# Altium footprint library 开关.PcbLib: 26 footprints (part 1 of 2)
Each footprint in its own frame and in the unit in brackets; x right, y up, seen from the top. Pads: shape width x height; smd on the part's side, far side on the other; paste and mask are expansions set on the pad; w line width, h text height; cw(c..) or ccw(c..) is an arc to the next point about the centre after c.
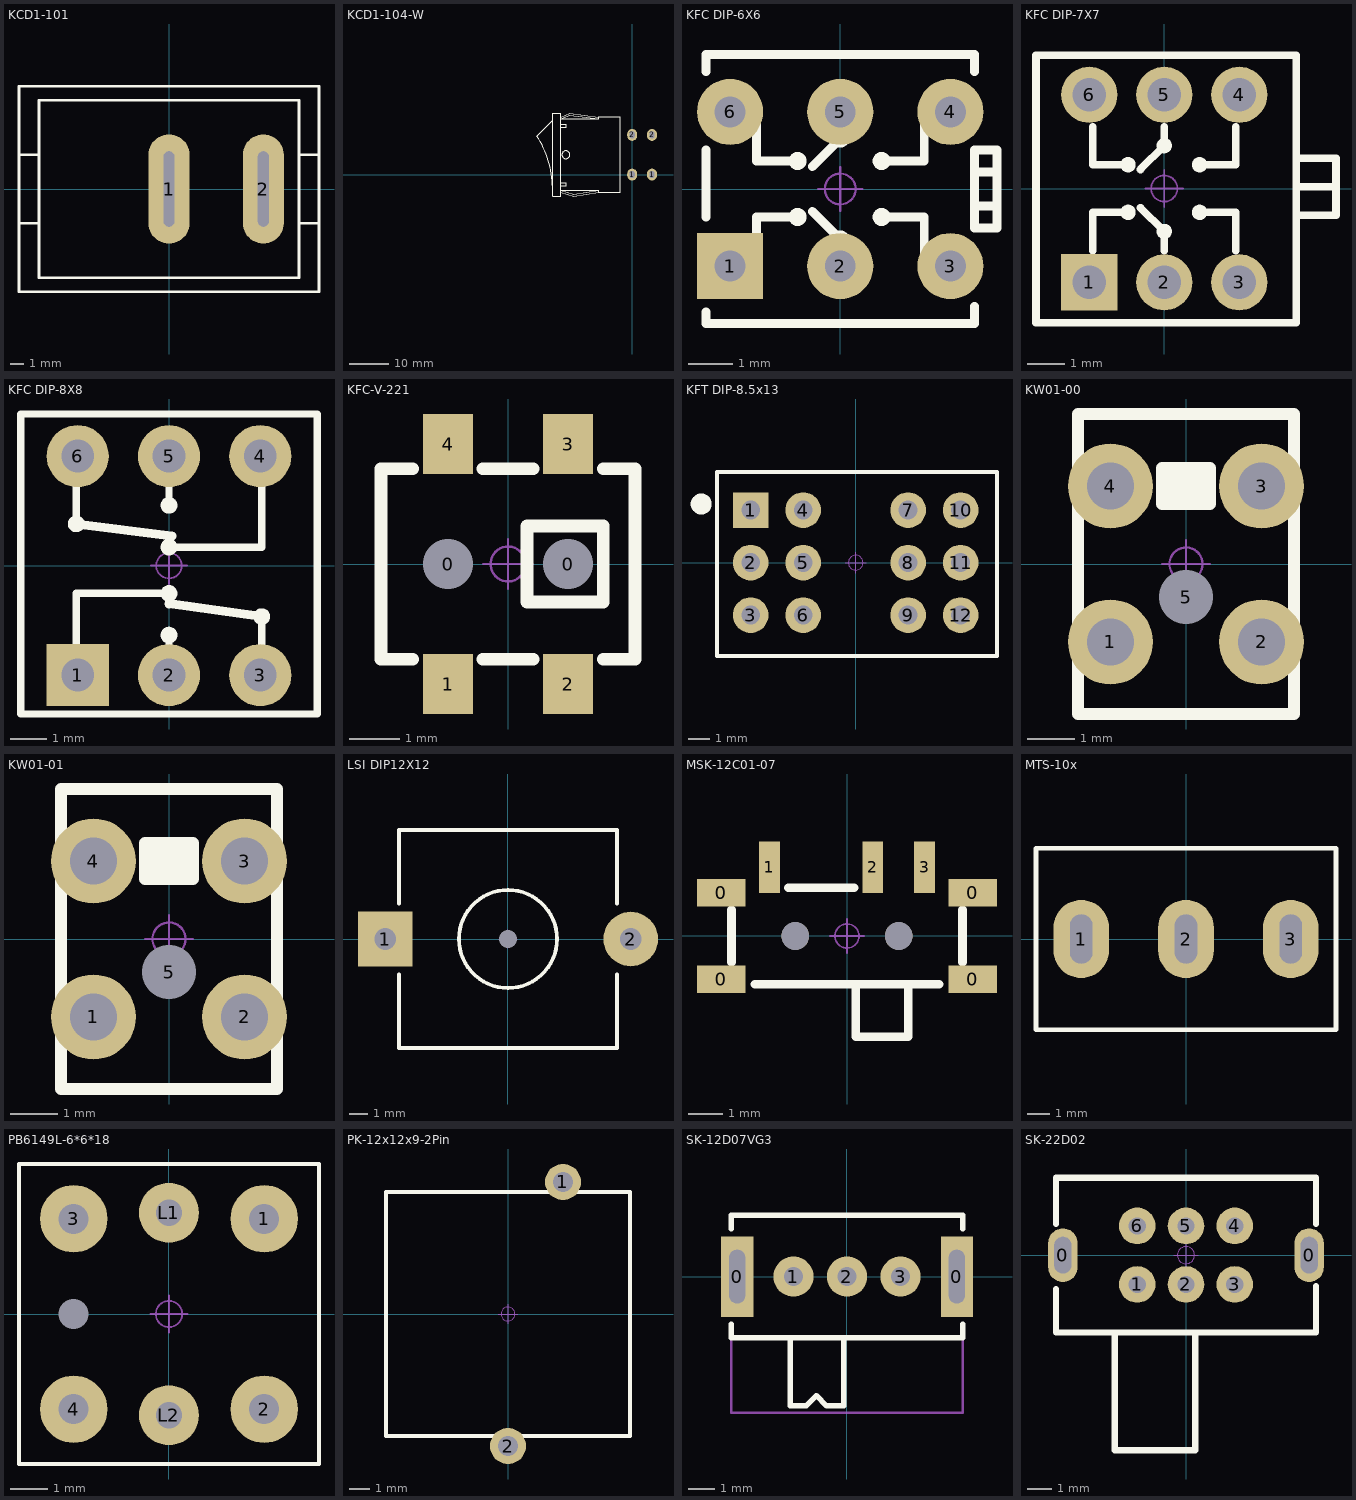
[diagram p0: the footprints below, top view; thin cyan lines are the x and y axes]

## KCD1-101 [mm] "船型开关立式"
pads (2):
  oval 3x8 hole 0.8 slot 5.5 at 90 deg: 1(0,0) 2(6.9,0)
Top Overlay:
  lines w0.203: -10.973,-2.5 -9.5,-2.5 ; -10.973,2.5 -9.5,2.5 ; 9.5,-2.5 10.973,-2.5 ; 9.5,2.5 10.973,2.5 ; -10.973,-7.518 -10.973,7.518 10.973,7.518 10.973,-7.518 -10.973,-7.518 ; -9.5,-6.5 -9.5,6.5 9.5,6.5 9.5,-6.5 -9.5,-6.5
Mechanical 15:
  circle w0.05: c0,0 r0.35
  lines w0.05: -0.5,0 0.5,0 ; 0,-0.5 0,0.5
3D body: height 20.3, standoff -5.8, extent -10.951,-7.5 10.95,7.5

## KCD1-104-W [mm] "船型开关-卧式"
pads (4):
  oval 2.5x3 hole 1.2 slot 1.7 at 90 deg mask+0: 1(0,0) 1(5,0) 2(0,10) 2(5,10)
Top Overlay:
  circle w0.1: c-16.7,5 r1
  lines w0.1: -20.041,-3.203 ccw(c-44.537,-3.63) -23.99,9.714 -19.994,13.71 ; -18,-4.5 -14.7,-5.5 -8.4,-4.5 ; -18,-4 -14.7,-5 -8.4,-4 ; -17.985,-4 -8.4,-4 ; -17.984,14.498 -15.684,15.498 -8.4,14.498 ; -17.972,-2.794 -16.575,-2.794 -16.575,-2.007 -17.972,-2.007 ; -17.972,11.862 -16.575,11.862 -16.575,12.649 -17.972,12.649 ; -8.4,13.995 -8.4,14.503 ; -8.4,14.5 -3,14.5 -3,-4.5 -8.4,-4.5 ; -8.4,-4.5 -8.4,-4 ; -20,-5.5 -18,-5.5 -18,15.5 -20,15.5 -20,-5.5 ; -17.984,13.998 -8.4,13.998 -15.684,14.998 -17.984,13.998
3D body: height 15.1, standoff -3.35, extent -24.2,-5.951 5.4,15.951

## KFC DIP-6X6 [mm] "自锁开关，规格：6*6*12.5mm"
pads (6):
  rect 1.5x1.5 hole 0.7: 1(-2.5,-1.75)
  round 1.5 hole 0.7: 2(0,-1.75) 3(2.5,-1.75) 4(2.5,1.75) 5(0,1.75) 6(-2.5,1.75)
Top Overlay:
  circle w0.254: c0.94,0.635 r0.076
  circle w0.254: c-0.965,0.635 r0.076
  circle w0.254: c0,1.143 r0.076
  circle w0.254: c0,-1.143 r0.076
  circle w0.254: c-0.965,-0.635 r0.076
  circle w0.254: c0.94,-0.635 r0.076
  lines w0.203: -3.048,-2.794 -3.048,-3.048 3.048,-3.048 3.048,-2.667 ; -3.048,-0.635 -3.048,0.889 ; -3.048,2.667 -3.048,3.048 3.048,3.048 3.048,2.667 ; -1.905,-1.651 -1.905,-0.635 -0.889,-0.635 ; -1.905,1.651 -1.905,0.635 -0.889,0.635 ; -0.635,-0.508 0,-1.143 0,-1.651 ; -0.635,0.508 0,1.143 0,1.651 ; 1.016,-0.635 1.905,-0.635 1.905,-1.651 ; 1.016,0.635 1.905,0.635 1.905,1.651 ; 3.048,-0.381 3.556,-0.381 ; 3.048,0.381 3.556,0.381 ; 3.048,-0.889 3.048,0.889 3.429,0.889 3.556,0.889 3.556,-0.889 3.048,-0.889
Mechanical 15:
  circle w0.05: c0,0 r0.35
  lines w0.05: -0.5,0 0.5,0 ; 0,-0.5 0,0.5
3D body: height 12.5, standoff -3.5, extent -3,-3 3.5,3

## KFC DIP-7X7 [mm] "自锁开关，规格：7*7mm"
pads (6):
  rect 1.5x1.5 hole 0.9: 1(-2,-2.5)
  round 1.5 hole 0.9: 2(0,-2.5) 3(2,-2.5) 4(2,2.5) 5(0,2.5) 6(-2,2.5)
Top Overlay:
  circle w0.254: c0.94,-0.635 r0.076
  circle w0.254: c-0.965,-0.635 r0.076
  circle w0.254: c0,-1.143 r0.076
  circle w0.254: c0,1.143 r0.076
  circle w0.254: c-0.965,0.635 r0.076
  circle w0.254: c0.94,0.635 r0.076
  lines w0.203: -1.905,-1.651 -1.905,-0.635 -0.889,-0.635 ; -1.905,1.651 -1.905,0.635 -0.889,0.635 ; -0.635,-0.508 0,-1.143 0,-1.651 ; -0.635,0.508 0,1.143 0,1.651 ; 1.016,-0.635 1.905,-0.635 1.905,-1.651 ; 1.016,0.635 1.905,0.635 1.905,1.651 ; 3.514,0.05 4.579,0.05 ; 3.563,-0.712 4.579,-0.712 4.579,0.812 3.563,0.812 ; -3.42,-3.581 3.514,-3.581 3.514,2.54 3.514,3.556 -3.42,3.556 -3.42,-3.581
Mechanical 15:
  circle w0.05: c0,0 r0.35
  lines w0.05: -0.5,0 0.5,0 ; 0,-0.5 0,0.5
3D body: height 11.2, standoff -3.2, extent -3.5,-3.5 3.5,3.5

## KFC DIP-8X8 [mm] "自锁开关，规格：8*8mm"
pads (6):
  rect 1.7x1.7 hole 0.9: 1(-2.5,-3)
  round 1.7 hole 0.9: 2(0,-3) 3(2.5,-3) 4(2.5,3) 5(0,3) 6(-2.5,3)
Top Overlay:
  circle w0.254: c-2.54,1.143 r0.102
  circle w0.254: c0,1.651 r0.102
  circle w0.254: c0,-1.905 r0.102
  circle w0.254: c2.54,-1.397 r0.102
  circle w0.254: c0,0.508 r0.102
  circle w0.254: c0,-0.762 r0.102
  lines w0.2: -4.064,-4.064 4.064,-4.064 4.064,4.153 -4.064,4.153 -4.064,-4.064
  lines w0.203: -2.54,-3.048 -2.54,-0.762 0,-0.762 ; -2.54,1.143 -2.54,2.794 ; 0,-3.048 0,-1.771 ; 0,0.508 2.54,0.508 2.54,2.794 ; 0,1.6 0,2.794 ; 2.54,-3.048 2.54,-1.397
  lines w0.254: -2.54,1.143 0.076,0.813 ; 0,-1.041 2.54,-1.397
Mechanical 15:
  circle w0.05: c0,0 r0.35
  lines w0.05: -0.5,0 0.5,0 ; 0,-0.5 0,0.5
3D body: height 13.1, standoff -3.2, extent -3.949,-3.949 4.051,4.051

## KFC-V-221 [mm] "长：4.75mm，宽：3.7mm，高：3.8mm"
pads (6):
  round 0.9 hole 1 unplated: 0(-1.2,0) 0(1.2,0)
  rect 1x1.2 smd: 1(-1.2,-2.4) 2(1.2,-2.4) 3(1.2,2.4) 4(-1.2,2.4)
Top Overlay:
  lines w0.254: -1.905,-1.905 -2.54,-1.905 -2.54,1.905 -1.905,1.905 ; -0.508,-1.905 0.508,-1.905 ; -0.508,1.905 0.508,1.905 ; 1.905,-1.905 2.54,-1.905 2.54,1.905 1.905,1.905 ; 0.381,-0.762 1.905,-0.762 1.905,0.762 0.381,0.762 0.381,-0.762
Mechanical 15:
  circle w0.05: c0,0 r0.35
  lines w0.05: -0.5,0 0.5,0 ; 0,-0.5 0,0.5
3D body: height 3.76, standoff -0.35, extent -2.375,-2.6 2.375,2.6

## KFT DIP-8.5x13 [mm] "自锁开关，规格：8.5*13mm"
pads (12):
  rect 1.7x1.7 hole 0.9: 1(-5,2.5)
  round 1.7 hole 0.9: 2(-5,0) 3(-5,-2.5) 4(-2.5,2.5) 5(-2.5,0) 6(-2.5,-2.5) 7(2.5,2.5) 8(2.5,0) 9(2.5,-2.5) 10(5,2.5) 11(5,0) 12(5,-2.5)
Top Overlay:
  circle w0.6: c-7.359,2.794 r0.2
  lines w0.2: -6.604,-4.445 6.731,-4.445 6.731,4.318 -6.604,4.318 -6.604,-4.445
Mechanical 15:
  circle w0.05: c0,0 r0.35
  lines w0.05: -0.5,0 0.5,0 ; 0,-0.5 0,0.5
3D body: height 14, standoff -3.2, extent -6.449,-4.301 6.551,4.199

## KW01-00 [mm] "长：6.4mm，宽：3.0mm，高：8.5mm"
pads (5):
  round 1.8 hole 1: 1(-1.6,-1.65) 2(1.6,-1.65) 3(1.6,1.65) 4(-1.6,1.65)
  round 1.1 hole 1.15 unplated: 5(0,-0.7)
Top Overlay:
  lines w0.254: -0.508,1.778 0.508,1.778 ; -0.381,1.524 0.508,1.524 ; -2.286,-3.175 2.286,-3.175 2.286,3.175 -2.286,3.175 -2.286,-3.175 ; -0.508,1.27 -0.508,2.032 0.508,2.032 0.508,1.27 -0.508,1.27
Mechanical 15:
  circle w0.05: c0,0 r0.35
  lines w0.05: -0.5,0 0.5,0 ; 0,-0.5 0,0.5
3D body: height 8.7, standoff -2.9, extent -2.128,-3 2.128,3

## KW01-01 [mm] "长：6.4mm，宽：3.0mm，高：11mm"
pads (5):
  round 1.8 hole 1: 1(-1.6,-1.65) 2(1.6,-1.65) 3(1.6,1.65) 4(-1.6,1.65)
  round 1.1 hole 1.15 unplated: 5(0,-0.7)
Top Overlay:
  lines w0.254: -0.508,1.778 0.508,1.778 ; -0.381,1.524 0.508,1.524 ; -2.286,-3.175 -2.286,3.175 2.286,3.175 2.286,-3.175 -2.286,-3.175 ; -0.508,1.27 0.508,1.27 0.508,2.032 -0.508,2.032 -0.508,1.27
Mechanical 15:
  circle w0.05: c0,0 r0.35
  lines w0.05: -0.5,0 0.5,0 ; 0,-0.5 0,0.5
3D body: height 11.2, standoff -2.9, extent -2.128,-3 2.128,3

## LSI DIP12X12 [mm] "12mm*12mm*9.4mm(长*宽*高)"
pads (3):
  round 0 hole 1: 0(0,0)
  rect 3x3 hole 1.2: 1(-6.75,0)
  round 3 hole 1.2: 2(6.75,0)
Top Overlay:
  circle w0.203: c0,0 r2.7
  lines w0.203: -6,-1.936 -6,-6 6,-6 6,-1.936 ; -6,1.936 -6,6 6,6 6,1.936
Mechanical 15:
  circle w0.05: c0,0 r0.35
  lines w0.05: -0.5,0 0.5,0 ; 0,-0.5 0,0.5
3D body: height 8.5, standoff -3.51, extent -6.925,-6 6.924,6

## MSK-12C01-07 [mm] "6.7*2.8*1.5mm(长宽高）"
pads (9):
  rect 1.4x0.8 smd: 0(-3.65,-1.25) 0(-3.65,1.25) 0(3.65,-1.25) 0(3.65,1.25)
  rect 0.6x1.5 smd: 1(-2.25,1.996) 2(0.75,1.996) 3(2.25,1.996)
  round 0.8 hole 0.8: " "(-1.5,0) " "(1.5,0)
Top Overlay:
  lines w0.254: -3.35,-0.762 -3.35,0.762 ; -2.667,-1.397 2.667,-1.397 ; -1.699,1.397 0.206,1.397 ; 0.254,-1.4 0.254,-2.921 1.778,-2.921 1.778,-1.4 ; 3.35,-0.762 3.35,0.762
Mechanical 15:
  circle w0.05: c0,0 r0.35
  lines w0.05: -0.5,0 0.5,0 ; 0,-0.5 0,0.5
3D body: height 1.5, standoff -0.5, extent -3.92,-2.9 3.92,2.4

## MTS-10x [mm] "MTS10系列3脚扭子开关"
pads (3):
  oval 2.5x3.5 hole 1 slot 2.2 at 90 deg unplated: 1(-4.7,0) 2(0,0) 3(4.7,0)
Top Overlay:
  lines w0.203: -6.731,-4.064 6.731,-4.064 6.731,4.064 -6.731,4.064 -6.731,-4.064
Mechanical 15:
  circle w0.05: c0,0 r0.35
  lines w0.05: -0.5,0 0.5,0 ; 0,-0.5 0,0.5
3D body: height 30.47, standoff -2.95, extent -6.6,-3.95 6.6,3.95

## PB6149L-6*6*18 [mm] "6mm*6mm*18mm(长*宽*高)"
pads (7):
  round 1.8 hole 0.8: 1(2.54,2.54) 2(2.54,-2.54) 3(-2.54,2.54) 4(-2.54,-2.54)
  round 0 hole 0.8: 7(-2.54,0)
  round 1.6 hole 0.7: L1(0,2.7) L2(0,-2.7)
Top Overlay:
  lines w0.1: -4,-4 -4,4 4,4 4,-4 -4,-4
Mechanical 15:
  circle w0.05: c0,0 r0.35
  lines w0.05: -0.5,0 0.5,0 ; 0,-0.5 0,0.5
3D body: height 18.05, standoff -3.45, extent -4,-4 4,4

## PK-12x12x9-2Pin [mm] "12x12x9mm"
pads (2):
  round 1.8 hole 1: 1(2.75,6.6) 2(0,-6.6)
Top Overlay:
  lines w0.203: -6.1,-6.1 -6.1,6.1 6.1,6.1 6.1,-6.1 -6.1,-6.1
Mechanical 15:
  circle w0.05: c0,0 r0.35
  lines w0.05: -0.5,0 0.5,0 ; 0,-0.5 0,0.5
3D body: height 9.15, standoff -2.95, extent -6,-6.85 6,6.85

## SK-12D07VG3 [mm] "侧脚支架小型拨动开关"
pads (5):
  rect 1.2x3 hole 0.6 slot 2 at 90 deg unplated: 0(-4.1,0) 0(4.1,0)
  round 1.5 hole 0.7 unplated: 1(-2,0) 2(0,0) 3(2,0)
Top Overlay:
  lines w0.203: -4.318,-1.778 -4.318,-2.286 4.318,-2.286 4.318,-1.778 ; -4.318,1.778 -4.318,2.286 4.318,2.286 4.318,1.778 ; -2.118,-2.286 -2.118,-4.826 -1.524,-4.826 ; -0.118,-2.286 -0.118,-4.826 -0.762,-4.826 ; -1.524,-4.826 -1.143,-4.445 -0.762,-4.826 ; -1.524,-4.826 -1.524,-4.826 ; -0.762,-4.826 -0.762,-4.826
Mechanical 15:
  circle w0.05: c0,0 r0.35
  lines w0.05: -0.5,0 0.5,0 ; 0,-0.5 0,0.5
  lines w0.1: -4.318,-5.08 4.318,-5.08 4.318,-2.286 -4.318,-2.286 -4.318,-5.08
3D body: height 4.75, standoff -2.44, extent -4.3,-4.85 4.3,2.25

## SK-22D02 [mm] "10.4x6.1x4.2mm(长宽高)，脚距：2mm"
pads (8):
  oval 1.2x2.2 hole 0.7 slot 1.5 at 90 deg: 0(-5.05,0) 0(5.05,0)
  round 1.5 hole 0.7: 1(-2,-1.2) 2(0,-1.2) 3(2,-1.2) 4(2,1.2) 5(0,1.2) 6(-2,1.2)
Top Overlay:
  lines w0.25: -5.334,-1.397 -5.334,-3.175 5.334,-3.175 5.334,-1.27 ; -5.334,1.27 -5.334,3.175 5.334,3.175 5.334,1.27 ; -2.921,-3.175 -2.921,-8.001 0.381,-8.001 0.381,-3.175
Mechanical 15:
  circle w0.05: c0,0 r0.35
  lines w0.05: -0.5,0 0.5,0 ; 0,-0.5 0,0.5
3D body: height 5.59, standoff -2.61, extent -5.266,-7.963 5.254,3.047